# Altium schematic symbol library IC.SchLib: 555 symbols (part 1 of 15)
Pins are listed as number, name and electrical type; pins without a type are passive.

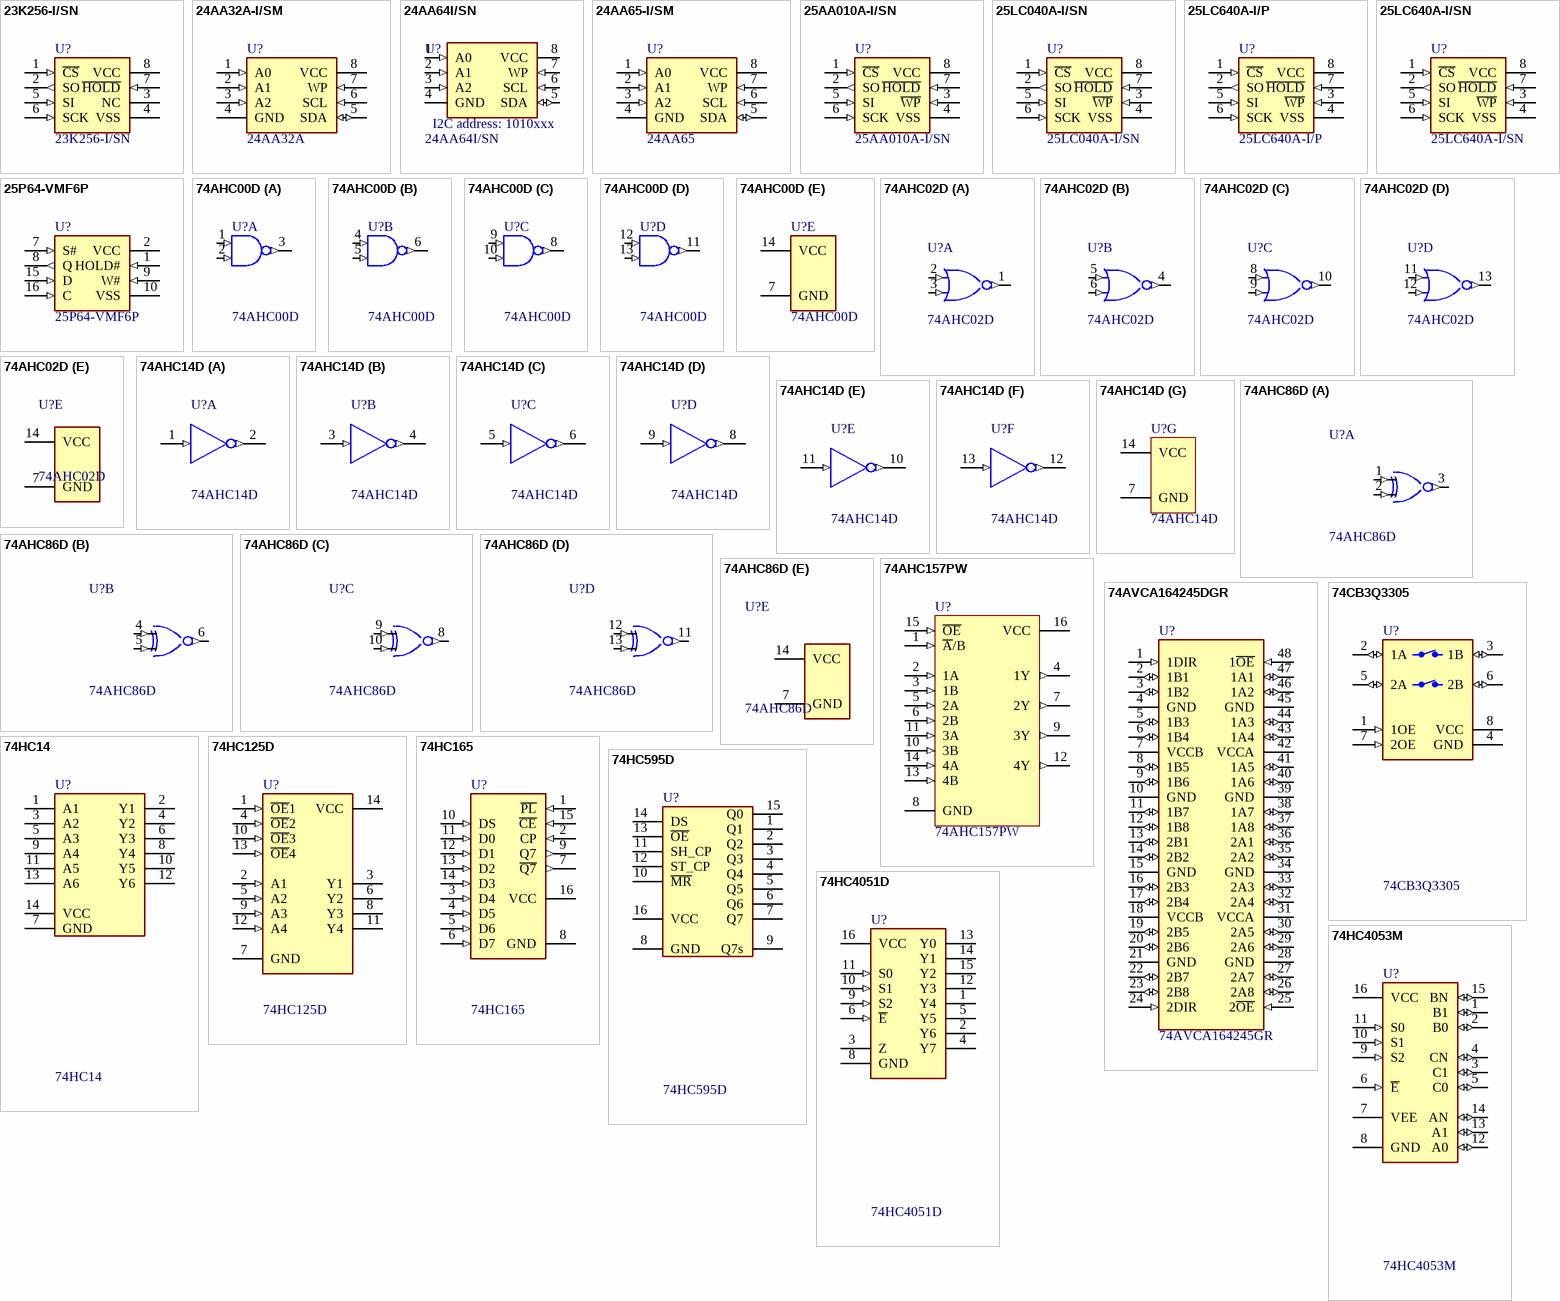
[diagram p0: symbols 23K256-I/SN to 74HC4053M]

## 23K256-I/SN
designator U?
SRAM 256kbit SPI SOIC8; Manufacturer: Microchip, Farnell; Manufacturer No: 23K256-I/SN, 1695547; Comment2: 256Kbit 2.7-3.6V 20MHz SPI; Sort: 510; Tech: SMDR; Package: SOIC8; Price: 1.5
signal-integrity model Model Name (Model Description)
footprint SOIC8-1
pins: 1 ~{CS} (in), 2 SO (out), 3 NC, 4 VSS (power), 5 SI (in), 6 SCK (in), 7 ~{HOLD} (in), 8 VCC (power)

## 24AA32A-I/SM
designator U?, comment 24AA32A
EEPROM 32K I2C Serial EEPROM 1.7-5.5V SOIC8; Manufacturer: Microchip; Manufacturer No: 24AA32A-I/SM; Sort: 510; Tech: SMDR; Package: SOIJ; Price: 0
signal-integrity model Model Name (Model Description)
footprint SOIC8W1 (SOIC 8 pin 5.3mm wide)
pins: 1 A0 (in), 2 A1 (in), 3 A2 (in), 4 GND (power), 5 SDA (io), 6 SCL (in), 7 WP (in), 8 VCC (power)

## 24AA64I/SN
designator U?  I2C address: 1010xxx
EEPROM 8kbyte I2C 1.7-5.5V SOIC8; Manufacturer: Microchip, Farnell; Manufacturer No: 24AA64I/SN, 1331304; Comment2: 1,7~5,5Vcc 3mAcc 400KHz; Sort: 510; Tech: SMDR; Package: SOIC8; Price: 0.6
signal-integrity model Model Name (Model Description)
footprint SOIC8-1
pins: 1 A0 (in), 2 A1 (in), 3 A2 (in), 4 GND (power), 5 SDA (io), 6 SCL (in), 7 WP (in), 8 VCC (power)

## 24AA65-I/SM
designator U?, comment 24AA65
EEPROM 64K I2C Smart Serial EEPROM 1.8-6.0V SOIC8; Manufacturer: Microchip; Manufacturer No: 24AA65-I/SM; Sort: 510; Tech: SMDR; Package: SOIJ; Price: 0
signal-integrity model Model Name (Model Description)
footprint SOIC8W1 (SOIC 8 pin 5.3mm wide)
pins: 1 A0 (in), 2 A1 (in), 3 A2 (in), 4 GND (power), 5 SDA (io), 6 SCL (in), 7 WP (in), 8 VCC (power)

## 25AA010A-I/SN
designator U?
EEPROM 1kbit SPI 1.8-5.5V SOIC8; Manufacturer: Microchip, Farnell; Manufacturer No: 25AA010A-I/SN, 1331339; Comment2: 1Kbit 1.8-5.5V 10MHz SPI; Sort: 510; Tech: SMDR; Package: SOIC8; Price: 0,5
signal-integrity model Model Name (Model Description)
footprint SOIC8-1
pins: 1 ~{CS} (in), 2 SO (out), 3 ~{WP} (in), 4 VSS (power), 5 SI (in), 6 SCK (in), 7 ~{HOLD} (in), 8 VCC (power)

## 25LC040A-I/SN
designator U?
EEPROM 4kbit SPI 2.5-5.5V SOIC8; Manufacturer: Microchip; Comment2: 4Kbit 2.5-5.5V 10MHz SPI; Sort: 510; Tech: SMDR; Manufacturer No: 25LC040A-I/SN; Package: SOIC8; Price: 0
signal-integrity model Model Name (Model Description)
footprint SOIC8-1
pins: 1 ~{CS} (in), 2 SO (out), 3 ~{WP} (in), 4 VSS (power), 5 SI (in), 6 SCK (in), 7 ~{HOLD} (in), 8 VCC (power)

## 25LC640A-I/P
designator U?
EEPROM 64kbit SPI 2.5-5.5V PDIP8; Manufacturer: Microchip; Comment2: 64Kbit 2.5-5.5V 10MHz SPI; Sort: 510; Tech: SMDR; Manufacturer No: 25LC640A-I/P; Package: PDIP8; Price: 0
signal-integrity model Model Name (Model Description)
footprint PDIL8 (DIP; 8 Leads; Row Spacing 7.62 mm; Pitch 2.54 mm)
pins: 1 ~{CS} (in), 2 SO (out), 3 ~{WP} (in), 4 VSS (power), 5 SI (in), 6 SCK (in), 7 ~{HOLD} (in), 8 VCC (power)

## 25LC640A-I/SN
designator U?
EEPROM 8kbit SPI 2.5-5.5V SOIC8; Manufacturer: Microchip; Comment2: 64Kbit 2.5-5.5V 10MHz SPI; Sort: 510; Tech: SMDR; Manufacturer No: 25LC640A-I/SN; Package: SOIC8; Price: 0
signal-integrity model Model Name (Model Description)
footprint SOIC8-1
pins: 1 ~{CS} (in), 2 SO (out), 3 ~{WP} (in), 4 VSS (power), 5 SI (in), 6 SCK (in), 7 ~{HOLD} (in), 8 VCC (power)

## 25P64-VMF6P
designator U?
EEPROM 64Mbit SPI 2.5-3.3V 33.3/68MHz read; Manufacturer: STM; Sort: 510; Tech: SMDR; Manufacturer No: 25P64-VMF6P; Package: SOIC16W; Price: 0
signal-integrity model Model Name (Model Description)
footprint SOIC16WN (SOIC, 16-Leads, Body 10,4x7,5mm (max), Pitch 1,27mm, IPC Medium Density)
pins: 1 HOLD# (in), 2 VCC (power), 7 S# (in), 8 Q (out), 9 W# (in), 10 VSS (power), 15 D (in), 16 C (in)

## 74AHC00D
designator U?
Quad NAND gate; Manufacturer No: SN74HC00D; Sort: 510; Tech: SMDR; Package: SOIC14; Price: 0
3D model D014 (14-Pin Small Outline Integrated Circuit 1.27 mm Pitch)
signal-integrity model SN74AHC14D
footprint SOIC14-1 (Small IC 14 pin)
part A pins: 1 A (in), 2 B (in), 3 Y (out)
part B pins: 4 B (in), 5 A (in), 6 Y (out)
part C pins: 8 Y (out), 9 B (in), 10 A (in)
part D pins: 11 Y (out), 12 B (in), 13 A (in)
part E pins: 7 GND (power), 14 VCC (power)

## 74AHC02D
designator U?
Quad NOR gate; Manufacturer No: SN74HC02D; Sort: 510; Tech: SMDR; Package: SOIC14; Price: 0
3D model D014 (14-Pin Small Outline Integrated Circuit 1.27 mm Pitch)
signal-integrity model SN74AHC14D
footprint SOIC14-1 (Small IC 14 pin)
part A pins: 1 Y (out), 2 A (in), 3 B (in)
part B pins: 4 Y (out), 5 A (in), 6 B (in)
part C pins: 8 A (in), 9 B (in), 10 Y (out)
part D pins: 11 A (in), 12 B (in), 13 Y (out)
part E pins: 7 GND (power), 14 VCC (power)

## 74AHC14D
designator U?
Hex Schmitt-Trigger Inverter; Sort: 510; Tech: SMDR; Package: SOIC14; Price: 0
3D model D014 (14-Pin Small Outline Integrated Circuit 1.27 mm Pitch)
signal-integrity model SN74AHC14D
footprint SOIC14-1 (Small IC 14 pin)
part A pins: 1 A (in), 2 Y (out)
part B pins: 3 A (in), 4 Y (out)
part C pins: 5 A (in), 6 Y (out)
part D pins: 8 Y (out), 9 A (in)
part E pins: 10 Y (out), 11 A (in)
part F pins: 12 Y (out), 13 A (in)
part G pins: 7 GND (power), 14 VCC (power)

## 74AHC86D
designator U?
Quad NAND gate; Manufacturer No: SN74HC86D; Sort: 510; Tech: SMDR; Package: SOIC14; Price: 0
3D model D014 (14-Pin Small Outline Integrated Circuit 1.27 mm Pitch)
signal-integrity model SN74AHC14D
footprint SOIC14-1 (Small IC 14 pin)
part A pins: 1 A (in), 2 B (in), 3 Y (out)
part B pins: 4 B (in), 5 A (in), 6 Y (out)
part C pins: 8 Y (out), 9 B (in), 10 A (in)
part D pins: 11 Y (out), 12 B (in), 13 A (in)
part E pins: 7 GND (power), 14 VCC (power)

## 74AHC157PW
designator U?
Quadruple 2-Line to 1-Line Data Selector/Multiplexer; Manufacturer No: SN74AHC157PWG4; Manufacturer: Texas; Tech: SMDR; Sort: 510; Package: TSSOP16
footprint TSSOP16 (TSSOP16 5x4.4mm R0.65mm)
signal-integrity model SN74AHC157PW
pins: 1 ~{A}/B (in), 2 1A (in), 3 1B (in), 4 1Y (out), 5 2A (in), 6 2B (in), 7 2Y (out), 8 GND (power), 9 3Y (out), 10 3B (in), 11 3A (in), 12 4Y (out), 13 4B (in), 14 4A (in), 15 ~{OE} (in), 16 VCC (power)

## 74AVCA164245DGR
designator U?, comment 74AVCA164245GR
16-BIT DUAL-SUPPLY BUS TRANSCEIVER; Manufacturer: Texas Instruments; Manufacturer No: SN74AVCA164245GR; Sort: 510; Tech: SMDR; Price: 0
footprint Model Name (Footprint not found)
footprint DGG048IT (Shrink Small Outline; 48 Leads; Body Width 6.1 mm; Pitch 0.5 mm)
pins: 1 1DIR (in), 2 1B1 (io), 3 1B2 (io), 4 GND (power), 5 1B3 (io), 6 1B4 (io), 7 VCCB (power), 8 1B5 (io), 9 1B6 (io), 10 GND (power), 11 1B7 (io), 12 1B8 (io), 13 2B1 (io), 14 2B2 (io), 15 GND (power), 16 2B3 (io), 17 2B4 (io), 18 VCCB (power), 19 2B5 (io), 20 2B6 (io), 21 GND (power), 22 2B7 (io), 23 2B8 (io), 24 2DIR (in), 25 2~{OE} (in), 26 2A8 (io), 27 2A7 (io), 28 GND (power), 29 2A6 (io), 30 2A5 (io), 31 VCCA (power), 32 2A4 (io), 33 2A3 (io), 34 GND (power), 35 2A2 (io), 36 2A1 (io), 37 1A8 (io), 38 1A7 (io), 39 GND (power), 40 1A6 (io), 41 1A5 (io), 42 VCCA (power), 43 1A4 (io), 44 1A3 (io), 45 GND (power), 46 1A2 (io), 47 1A1 (io), 48 1~{OE} (in)

## 74CB3Q3305
designator U?
Dual FET bus switch 2.5-3.3V high bandwidth; Manufacturer: Texas, Farnell; Manufacturer No: SN74CB3Q3305, 1601165; Sort: 510; Tech: SMDR; Package: TSSOP8; Comment2: 2.5-3.3V; Price: 1; RevDate: 10.03.2009 LZ
footprint TSSOP8-PW (TSSOP8 3x3mm R0.65mm)
pins: 1 1OE (in), 2 1A (io), 3 1B (io), 4 GND (power), 5 2A (io), 6 2B (io), 7 2OE (in), 8 VCC (power)

## 74HC14
designator U?
Hex Inverting Schmitt Trigger; Manufacturer: Fairchild, Farnell; Manufacturer No: MM74HC14M, 1013958; Sort: 510; Tech: SMDR; Package: SOIC14; Price: 0.4
footprint SOIC14-1 (Small IC 14 pin)
pins: 1 A1, 2 Y1, 3 A2, 4 Y2, 5 A3, 6 Y3, 7 GND, 8 Y4, 9 A4, 10 Y5, 11 A5, 12 Y6, 13 A6, 14 VCC (power)

## 74HC125D
designator U?
Quadruple Bus Buffer Gate with 3-State Outputs; Manufacturer No: SN74AHC125D; Manufacturer: Texas; Tech: SMDR; Sort: 510; Package: SOIC14
footprint SOIC14-1 (Small IC 14 pin)
pins: 1 ~{OE}1 (in), 2 A1 (in), 3 Y1 (hiz), 4 ~{OE}2 (in), 5 A2 (in), 6 Y2 (hiz), 7 GND (power), 8 Y3 (hiz), 9 A3 (in), 10 ~{OE}3 (in), 11 Y4 (hiz), 12 A4 (in), 13 ~{OE}4 (in), 14 VCC (power)

## 74HC165
designator U?
Quadruple 2-Line to 1-Line Data Selector/Multiplexer; Manufacturer: Texas; Tech: SMDR; Sort: 510; Manufacturer No: 74HC165; Package: TSSOP16
footprint TSSOP16 (TSSOP16 5x4.4mm R0.65mm)
signal-integrity model SN74AHC157PW
pins: 1 ~{PL} (in), 2 CP (in), 3 D4 (in), 4 D5 (in), 5 D6 (in), 6 D7 (in), 7 ~{Q7} (out), 8 GND (power), 9 Q7 (out), 10 DS (in), 11 D0 (in), 12 D1 (in), 13 D2 (in), 14 D3 (in), 15 ~{CE} (in), 16 VCC (power)

## 74HC595D
designator U?
8-bit serial-in, serial or parallel-out  shift register with output latches;  3-state; Manufacturer: NXP, Farnell; Manufacturer No: 74HC595D, 1201269; Sort: 510; Tech: SMDR; Package: SOIC16; Price: 0.4
footprint SOIC16-1 (Small IC 16 pin)
pins: 1 Q1, 2 Q2, 3 Q3, 4 Q4, 5 Q5, 6 Q6, 7 Q7, 8 GND, 9 Q7s, 10 ~{MR}, 11 SH_CP, 12 ST_CP, 13 ~{OE}, 14 DS, 15 Q0, 16 VCC (power)

## 74HC4051D
designator U?
8-channel analog multiplexer/demultiplexer; Manufacturer: NXP; Sort: 510; Tech: SMDR; Manufacturer No: 74HC4051D; Package: SOIC16; Price: 0.4
footprint SOIC16-1 (Small IC 16 pin)
pins: 1 Y4, 2 Y6, 3 Z, 4 Y7, 5 Y5, 6 ~{E} (in), 8 GND (power), 9 S2 (in), 10 S1 (in), 11 S0 (in), 12 Y3, 13 Y0, 14 Y1, 15 Y2, 16 VCC (power)

## 74HC4053M
designator U?
3x2-channel analog multiplexer/demultiplexer; Manufacturer: Texas, Farnell; Manufacturer No: 74HC4053M, 1103172; Sort: 510; Tech: SMDR; Package: SOIC16; Price: 0.4
footprint SOIC16-1 (Small IC 16 pin)
pins: 1 B1 (io), 2 B0 (io), 3 C1 (io), 4 CN (io), 5 C0 (io), 6 ~{E} (in), 7 VEE (power), 8 GND (power), 9 S2 (in), 10 S1 (in), 11 S0 (in), 12 A0 (io), 13 A1 (io), 14 AN (io), 15 BN (io), 16 VCC (power)

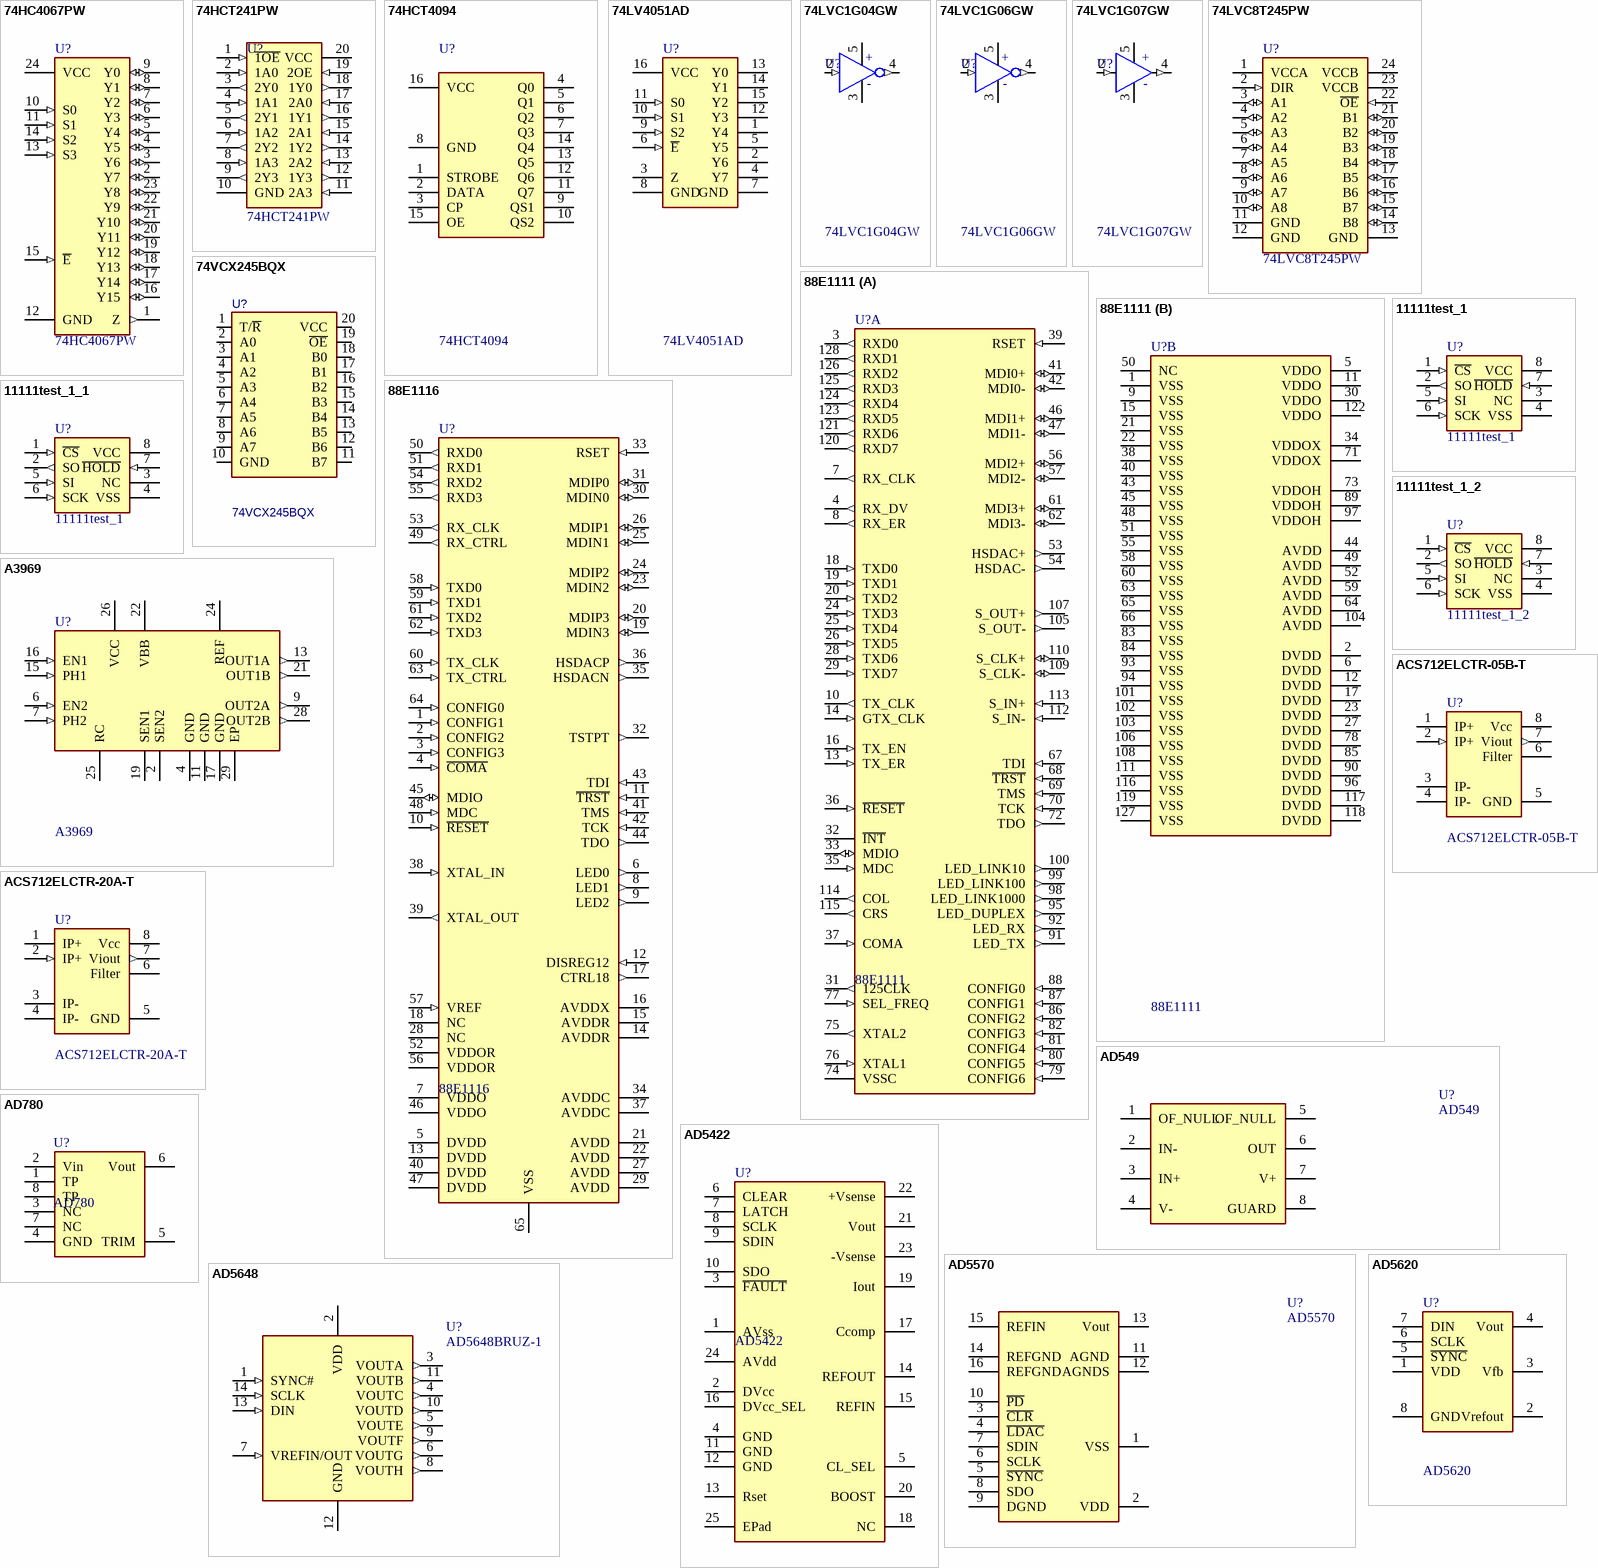
[diagram p1: symbols 74HC4067PW to AD5648]

## 74HC4067PW
designator U?
16-channel analog multiplexer/demultiplexer; Manufacturer: NXP; Sort: 510; Tech: SMDR; Manufacturer No: 74HC4067PW; Package: TSSOP24; Price: 0.4
footprint TSSOP24-TI (Plastic Small Outline 24pin R0.65mm 7.8x4.4x1.2mm)
pins: 1 Z (out), 2 Y7 (io), 3 Y6 (io), 4 Y5 (io), 5 Y4 (io), 6 Y3 (io), 7 Y2 (io), 8 Y1 (io), 9 Y0 (io), 10 S0 (in), 11 S1 (in), 12 GND (power), 13 S3 (in), 14 S2 (in), 15 ~{E} (in), 16 Y15 (io), 17 Y14 (io), 18 Y13 (io), 19 Y12 (io), 20 Y11 (io), 21 Y10 (io), 22 Y9 (io), 23 Y8 (io), 24 VCC (power)

## 74HCT241PW
designator U?
Octal buffer/line driver; 3-state; Manufacturer: NXP; Sort: 510; Tech: SMDR; Manufacturer No: 74HCT241PW; Package: TSSOP20; Price: 0
footprint TSSOP20N (TSOP 20, Body 6,6x4,5mm, R0,65mm, IPC Medium Density)
pins: 1 ~{1OE} (in), 2 1A0 (in), 3 2Y0 (out), 4 1A1 (in), 5 2Y1 (out), 6 1A2 (in), 7 2Y2 (out), 8 1A3 (in), 9 2Y3 (out), 10 GND (power), 11 2A3 (in), 12 1Y3 (out), 13 2A2 (in), 14 1Y2 (out), 15 2A1 (in), 16 1Y1 (out), 17 2A0 (in), 18 1Y0 (out), 19 2OE (in), 20 VCC (power)

## 74HCT4094
designator U?
High-Speed CMOS Logic 8-Stage Shift and Store Bus Register, Three State; Manufacturer: Texas; Manufacturer No: CD74HCT4094M; Sort: 510; Tech: SMDR; Package: SOIC16; Price: 0.4
footprint SOIC16-1 (Small IC 16 pin)
pins: 1 STROBE, 2 DATA, 3 CP, 4 Q0, 5 Q1, 6 Q2, 7 Q3, 8 GND, 9 QS1, 10 QS2, 11 Q7, 12 Q6, 13 Q5, 14 Q4, 15 OE, 16 VCC

## 74LV4051AD
designator U?
8-channel analog multiplexer/demultiplexer; Manufacturer: Texas, Farnell; Manufacturer No: SN74LV4051AD, 1740189; Comment2: 2-5.5Vcc; Sort: 510; Tech: SMDR; Package: SOIC16; Price: 0.4
footprint SOIC16-1 (Small IC 16 pin)
pins: 1 Y4, 2 Y6, 3 Z, 4 Y7, 5 Y5, 6 ~{E} (in), 7 GND (power), 8 GND (power), 9 S2 (in), 10 S1 (in), 11 S0 (in), 12 Y3, 13 Y0, 14 Y1, 15 Y2, 16 VCC (power)

## 74LVC1G04GW
designator U?
Single inverter; 5 V tolerant input; ±24 mA output (3V); Manufacturer: NXP; Comment2: 1.65V to 5.5V; Sort: 510; Tech: SMDR; Manufacturer No: 74LVC1G04GW; Package: TSSOP5; Price: 0
footprint SC70-5 (5-Leads, Body 2,0x2,1mm (max), Pitch 0,65mm, IPC Medium Density)
pins: 2 A (in), 3 GND (power), 4 Y (out), 5 VCC (power)
text: +; -

## 74LVC1G06GW
designator U?
Single Inverter; 5 V tolerant input; -24 mA open drain output (3V); Manufacturer: NXP; Comment2: 1.65V to 5.5V; Sort: 510; Tech: SMDR; Manufacturer No: 74LVC1G06GW; Package: SC70-5; Price: 0
footprint SC70-5 (5-Leads, Body 2,0x2,1mm (max), Pitch 0,65mm, IPC Medium Density)
pins: 2 A (in), 3 GND (power), 4 Y (out), 5 VCC (power)
text: +; -

## 74LVC1G07GW
designator U?
Single buffer; 5 V tolerant input; -24 mA open drain output (3V); Manufacturer: NXP; Comment2: 1.65V to 5.5V; Sort: 510; Tech: SMDR; Manufacturer No: 74LVC1G07GW; Package: SC70-5; Price: 0
footprint SC70-5 (5-Leads, Body 2,0x2,1mm (max), Pitch 0,65mm, IPC Medium Density)
pins: 2 A (in), 3 GND (power), 4 Y (out), 5 VCC (power)
text: +; -

## 74LVC8T245PW
designator U?
8-BIT DUAL-SUPPLY BUS TRANSCEIVER; Manufacturer: Texas Instruments; Manufacturer No: SN74LVC8T245PW; Sort: 510; Tech: SMDR; Price: 0
footprint TSSOP24-TI (Plastic Small Outline 24pin R0.65mm 7.8x4.4x1.2mm)
signal-integrity model Model Name (Model Description)
pins: 1 VCCA (power), 2 DIR (in), 3 A1 (io), 4 A2 (io), 5 A3 (io), 6 A4 (io), 7 A5 (io), 8 A6 (io), 9 A7 (io), 10 A8 (io), 11 GND (power), 12 GND (power), 13 GND (power), 14 B8 (io), 15 B7 (io), 16 B6 (io), 17 B5 (io), 18 B4 (io), 19 B3 (io), 20 B2 (io), 21 B1 (io), 22 ~{OE} (in), 23 VCCB (power), 24 VCCB (power)

## 74VCX245BQX
designator U?
Low Voltage Bidirectional Transceiver  with 3.6V Tolerant Inputs and Outputs; Manufacturer: Fairchild, Mouser; Manufacturer No: 74VCX245BQX, 512-74VCX245BQX; Comment2: 1.4..3.6Vcc; Sort: 510; Tech: SMDR; Package: DQFN20 4.5x2.5mm; Price: 0.95
footprint QFN50P250X450X80-20N (QFN, 20-Leads, Body 4,5x2,5mm (max), Pitch 0,50mm, IPC Medium Density)
signal-integrity model Model Name (Model Description)
pins: 1 T/~{R} (io), 2 A0 (io), 3 A1 (io), 4 A2 (io), 5 A3 (io), 6 A4 (io), 7 A5 (io), 8 A6 (io), 9 A7 (io), 10 GND (io), 11 B7 (io), 12 B6 (io), 13 B5 (io), 14 B4 (io), 15 B3 (io), 16 B2 (io), 17 B1 (io), 18 B0 (io), 19 ~{OE} (io), 20 VCC (io), 21 EP (power)

## 88E1111
designator U?
Single Port 10/100 Mb/s Ethernet Physical Layer Transceiver; Manufacturer: Marvell; Manufacturer No: 88E1111-B2-RCJ-1C000; Sort: 510; Tech: SMDR; Package: PQFP128; Price: 0
footprint PQFP128-1 (PQFP, 128-Leads, Body 23,4x17,4mm (max), Pitch 0,50mm, IPC Medium Density)
part A pins: 3 RXD0 (out), 4 RX_DV (out), 7 RX_CLK (out), 8 RX_ER (out), 10 TX_CLK (out), 13 TX_ER (in), 14 GTX_CLK (in), 16 TX_EN (in), 18 TXD0 (in), 19 TXD1 (in), 20 TXD2 (in), 24 TXD3 (in), 25 TXD4 (in), 26 TXD5 (in), 28 TXD6 (in), 29 TXD7 (in), 31 125CLK (out), 32 ~{INT} (oc), 33 MDIO (io), 35 MDC (in), 36 ~{RESET} (in), 37 COMA (in), 39 RSET (in), 41 MDI0+ (io), 42 MDI0- (io), 46 MDI1+ (io), 47 MDI1- (io), 53 HSDAC+ (out), 54 HSDAC- (out), 56 MDI2+ (io), 57 MDI2- (io), 61 MDI3+ (io), 62 MDI3- (io), 67 TDI (in), 68 ~{TRST} (in), 69 TMS (in), 70 TCK (in), 72 TDO (out), 74 VSSC (power), 75 XTAL2 (out), 76 XTAL1 (in), 77 SEL_FREQ (in), 79 CONFIG6 (in), 80 CONFIG5 (in), 81 CONFIG4 (in), 82 CONFIG3 (in), 86 CONFIG2 (in), 87 CONFIG1 (in), 88 CONFIG0 (in), 91 LED_TX (out), 92 LED_RX (out), 95 LED_DUPLEX (out), 98 LED_LINK1000 (out), 99 LED_LINK100 (out), 100 LED_LINK10 (out), 105 S_OUT- (out), 107 S_OUT+ (out), 109 S_CLK- (io), 110 S_CLK+ (io), 112 S_IN- (in), 113 S_IN+ (in), 114 COL (out), 115 CRS (out), 120 RXD7 (out), 121 RXD6 (out), 123 RXD5 (out), 124 RXD4 (out), 125 RXD3 (out), 126 RXD2 (out), 128 RXD1 (out)
part B pins: 1 VSS (power), 2 DVDD (power), 5 VDDO (power), 6 DVDD (power), 9 VSS (power), 11 VDDO (power), 12 DVDD (power), 15 VSS (power), 17 DVDD (power), 21 VSS (power), 22 VSS (power), 23 DVDD (power), 27 DVDD (power), 30 VDDO (power), 34 VDDOX (power), 38 VSS (power), 40 VSS (power), 43 VSS (power), 44 AVDD (power), 45 VSS (power), 48 VSS (power), 49 AVDD (power), 50 NC, 51 VSS (power), 52 AVDD (power), 55 VSS (power), 58 VSS (power), 59 AVDD (power), 60 VSS (power), 63 VSS (power), 64 AVDD (power), 65 VSS (power), 66 VSS (power), 71 VDDOX (power), 73 VDDOH (power), 78 DVDD (power), 83 VSS (power), 84 VSS (power), 85 DVDD (power), 89 VDDOH (power), 90 DVDD (power), 93 VSS (power), 94 VSS (power), 96 DVDD (power), 97 VDDOH (power), 101 VSS (power), 102 VSS (power), 103 VSS (power), 104 AVDD (power), 106 VSS (power), 108 VSS (power), 111 VSS (power), 116 VSS (power), 117 DVDD (power), 118 DVDD (power), 119 VSS (power), 122 VDDO (power), 127 VSS (power)

## 88E1116
designator U?
Single Port 10/100/1000 Mb/s Ethernet Physical Layer Transceiver; Manufacturer: Marvell; Manufacturer No: 88e1116-XX-NNC1C000; Comment2: XX is custom code; Sort: 510; Tech: SMDR; Package: QFN64LT; Price: 0
footprint QFN64LT-2
pins: 1 CONFIG1 (in), 2 CONFIG2 (in), 3 CONFIG3 (in), 4 ~{COMA} (in), 5 DVDD (power), 6 LED0 (out), 7 VDDO (power), 8 LED1 (out), 9 LED2 (out), 10 ~{RESET} (in), 11 ~{TRST} (in), 12 DISREG12 (in), 13 DVDD (power), 14 AVDDR (power), 15 AVDDR (power), 16 AVDDX (power), 17 CTRL18 (out), 18 NC, 19 MDIN3 (io), 20 MDIP3 (io), 21 AVDD (power), 22 AVDD (power), 23 MDIN2 (io), 24 MDIP2 (io), 25 MDIN1 (io), 26 MDIP1 (io), 27 AVDD (power), 28 NC, 29 AVDD (power), 30 MDIN0 (io), 31 MDIP0 (io), 32 TSTPT (out), 33 RSET (in), 34 AVDDC (power), 35 HSDACN (out), 36 HSDACP (out), 37 AVDDC (power), 38 XTAL_IN (in), 39 XTAL_OUT (out), 40 DVDD (power), 41 TMS (in), 42 TCK (in), 43 TDI (in), 44 TDO (out), 45 MDIO (io), 46 VDDO (power), 47 DVDD (power), 48 MDC (in), 49 RX_CTRL (out), 50 RXD0 (out), 51 RXD1 (out), 52 VDDOR (power), 53 RX_CLK (out), 54 RXD2 (out), 55 RXD3 (out), 56 VDDOR (power), 57 VREF (in), 58 TXD0 (in), 59 TXD1 (in), 60 TX_CLK (in), 61 TXD2 (in), 62 TXD3 (in), 63 TX_CTRL (in), 64 CONFIG0 (in), 65 VSS (power)

## 11111test_1
designator U?
SRAM 256kbit SPI SOIC8; Manufacturer: Microchip, Farnell; Manufacturer No: 23K256-I/SN, 1695547; Comment2: 256Kbit 2.7-3.6V 20MHz SPI; Sort: 510; Tech: SMDR; Package: SOIC8; Price: 1.5
signal-integrity model Model Name (Model Description)
footprint SOIC8-1
pins: 1 ~{CS} (in), 2 SO (out), 3 NC, 4 VSS (power), 5 SI (in), 6 SCK (in), 7 ~{HOLD} (in), 8 VCC (power)

## 11111test_1_1
designator U?, comment 11111test_1
SRAM 256kbit SPI SOIC8; Manufacturer: Microchip, Farnell; Manufacturer No: 23K256-I/SN, 1695547; Comment2: 256Kbit 2.7-3.6V 20MHz SPI; Sort: 510; Tech: SMDR; Package: SOIC8; Price: 1.5
signal-integrity model Model Name (Model Description)
footprint SOIC8-1
pins: 1 ~{CS} (in), 2 SO (out), 3 NC, 4 VSS (power), 5 SI (in), 6 SCK (in), 7 ~{HOLD} (in), 8 VCC (power)

## 11111test_1_2
designator U?
SRAM 256kbit SPI SOIC8; Manufacturer: Microchip, Farnell; Manufacturer No: 23K256-I/SN, 1695547; Comment2: 256Kbit 2.7-3.6V 20MHz SPI; Sort: 510; Tech: SMDR; Package: SOIC8; Price: 1.5
signal-integrity model Model Name (Model Description)
footprint SOIC8-1
pins: 1 ~{CS} (in), 2 SO (out), 3 NC, 4 VSS (power), 5 SI (in), 6 SCK (in), 7 ~{HOLD} (in), 8 VCC (power)

## A3969
designator U?
Dual Full-Bridge PWM Motor Driver; Manufacturer: Allegro; Manufacturer No: A3969SETTR-T; Sort: 510; Tech: SMDR; Package: QFN28; Price: 0
signal-integrity model Model Name (Model Description)
footprint QFN28-1 (QFN28; 28 Leads; Body Width 5.0 mm; Pitch 0.5 mm)
pins: 2 SEN2, 4 GND (power), 6 EN2 (in), 7 PH2 (in), 9 OUT2A (out), 11 GND (power), 13 OUT1A (out), 15 PH1 (in), 16 EN1 (in), 17 GND (power), 19 SEN1, 21 OUT1B (out), 22 VBB (power), 24 REF, 25 RC, 26 VCC (power), 28 OUT2B (out), 29 EP (power)

## ACS712ELCTR-05B-T
designator U?
Current Sensor Bidirectional 80KHz 5A; Manufacturer: Allegro, Farnell; Manufacturer No: ACS712ELCTR-05B-T, 1329623; Comment2: 4.5-5.5V  5Arange; Sort: 510; Tech: SMDR; Package: SOIC8; Price: 3.3
footprint SOIC8-1
pins: 1 IP+ (power), 2 IP+ (in), 3 IP- (power), 4 IP- (power), 5 GND (power), 6 Filter, 7 Viout (out), 8 Vcc (power)

## ACS712ELCTR-20A-T
designator U?
Current Sensor Bidirectional 80KHz 20A; Manufacturer: Allegro, Farnell; Manufacturer No: ACS712ELCTR-20A-T, 1329624; Comment2: 4.5-5.5V  20Arange; Sort: 510; Tech: SMDR; Package: SOIC8; Price: 3.3
footprint SOIC8-1
pins: 1 IP+ (power), 2 IP+ (in), 3 IP- (power), 4 IP- (power), 5 GND (power), 6 Filter, 7 Viout (out), 8 Vcc (power)

## AD549
designator U?
Ultralow Input Bias Current Operational Amplifier; Manufacturer: Analog Devices; Manufacturer No: AD549KHZ; Sort: 510; Tech: THDW; Package: TO99; Price: 0
footprint TO99 (TO-99)
pins: 1 OF_NULL, 2 IN-, 3 IN+, 4 V-, 5 OF_NULL, 6 OUT, 7 V+, 8 GUARD

## AD780
designator U?
High precision Reference 2.5/3.0V; Manufacturer: Analog, Farnell; Comment2: 2.5/3.0Vout 4..36Vin 0.04% 3ppm/C; Sort: 520; Tech: SMDR; Package: SOIC8; Price: 7,2
footprint SOIC8-1
pins: 1 TP, 2 Vin (power), 3 NC, 4 GND (power), 5 TRIM, 6 Vout (power), 7 NC, 8 TP

## AD5422
designator U?
Single Channel, 12-/16-Bit, Serial Input  Current Source and Voltage Output DACs; Manufacturer: Analog Devices; Manufacturer No: AD5422BREZ; Comment2: 16bit +/-5V SPI; Sort: 510; Tech: SMDR; Package: TSSOP24; Price: 0
signal-integrity model Model Name (Model Description)
footprint TSOP65P640X120_HS-24N (TSOP, 24-Leads, Body 7,9x4,5mm (max), Pitch 0,65mm, IPC Medium Density)
pins: 1 AVss (power), 2 DVcc (power), 3 ~{FAULT}, 4 GND (power), 5 CL_SEL, 6 CLEAR, 7 LATCH, 8 SCLK, 9 SDIN, 10 SDO, 11 GND (power), 12 GND (power), 13 Rset, 14 REFOUT, 15 REFIN, 16 DVcc_SEL, 17 Ccomp, 18 NC, 19 Iout, 20 BOOST, 21 Vout, 22 +Vsense, 23 -Vsense, 24 AVdd (power), 25 EPad (power)

## AD5570
designator U?
True Accuracy, 16-Bit ±12 V/±15 V,  Serial Input Voltage Output DAC; Manufacturer: Analog Devices; Manufacturer No: AD5570ARSZ; Sort: 510; Tech: SMDR; Package: SSOP16; Price: 0
footprint SOP65P780X200-16N (SOP, 16-Leads, Body 6,5x5,6mm (max), Pitch 0,65mm, IPC Medium Density)
pins: 1 VSS (power), 2 VDD (power), 3 ~{CLR}, 4 ~{LDAC}, 5 ~{SYNC}, 6 SCLK, 7 SDIN, 8 SDO, 9 DGND, 10 ~{PD}, 11 AGND, 12 AGNDS, 13 Vout, 14 REFGND, 15 REFIN, 16 REFGND

## AD5620
designator U?
Single, 12-/14-/16-Bit nanoDAC with 5ppm/C On.Chip Reference; Manufacturer: Analog Devices; Manufacturer No: AD5620CRMZ-2; Comment2: 12bit 3/5V SPI; Sort: 510; Tech: SMDR; Package: MSOP; Price: 0
signal-integrity model Model Name (Model Description)
footprint TSSOP8 (TSSOP8 3x3mm R0.65mm)
pins: 1 VDD, 2 Vrefout, 3 Vfb, 4 Vout, 5 ~{SYNC}, 6 SCLK, 7 DIN, 8 GND

## AD5648
designator U?, comment AD5648BRUZ-1
ADC 14bit Quad; Manufacturer: Analog Devices; Sort: 510; Tech: SMDR; Manufacturer No: AD5648BRUZ-1; Package: TSSOP14; Price: 0
footprint TSSOP14 (TSSOP16 5x4.4mm R0.65mm)
pins: 1 SYNC# (in), 2 VDD (power), 3 VOUTA (out), 4 VOUTC (out), 5 VOUTE (out), 6 VOUTG (out), 7 VREFIN/OUT (in), 8 VOUTH (out), 9 VOUTF (out), 10 VOUTD (out), 11 VOUTB (out), 12 GND (power), 13 DIN (in), 14 SCLK (in)

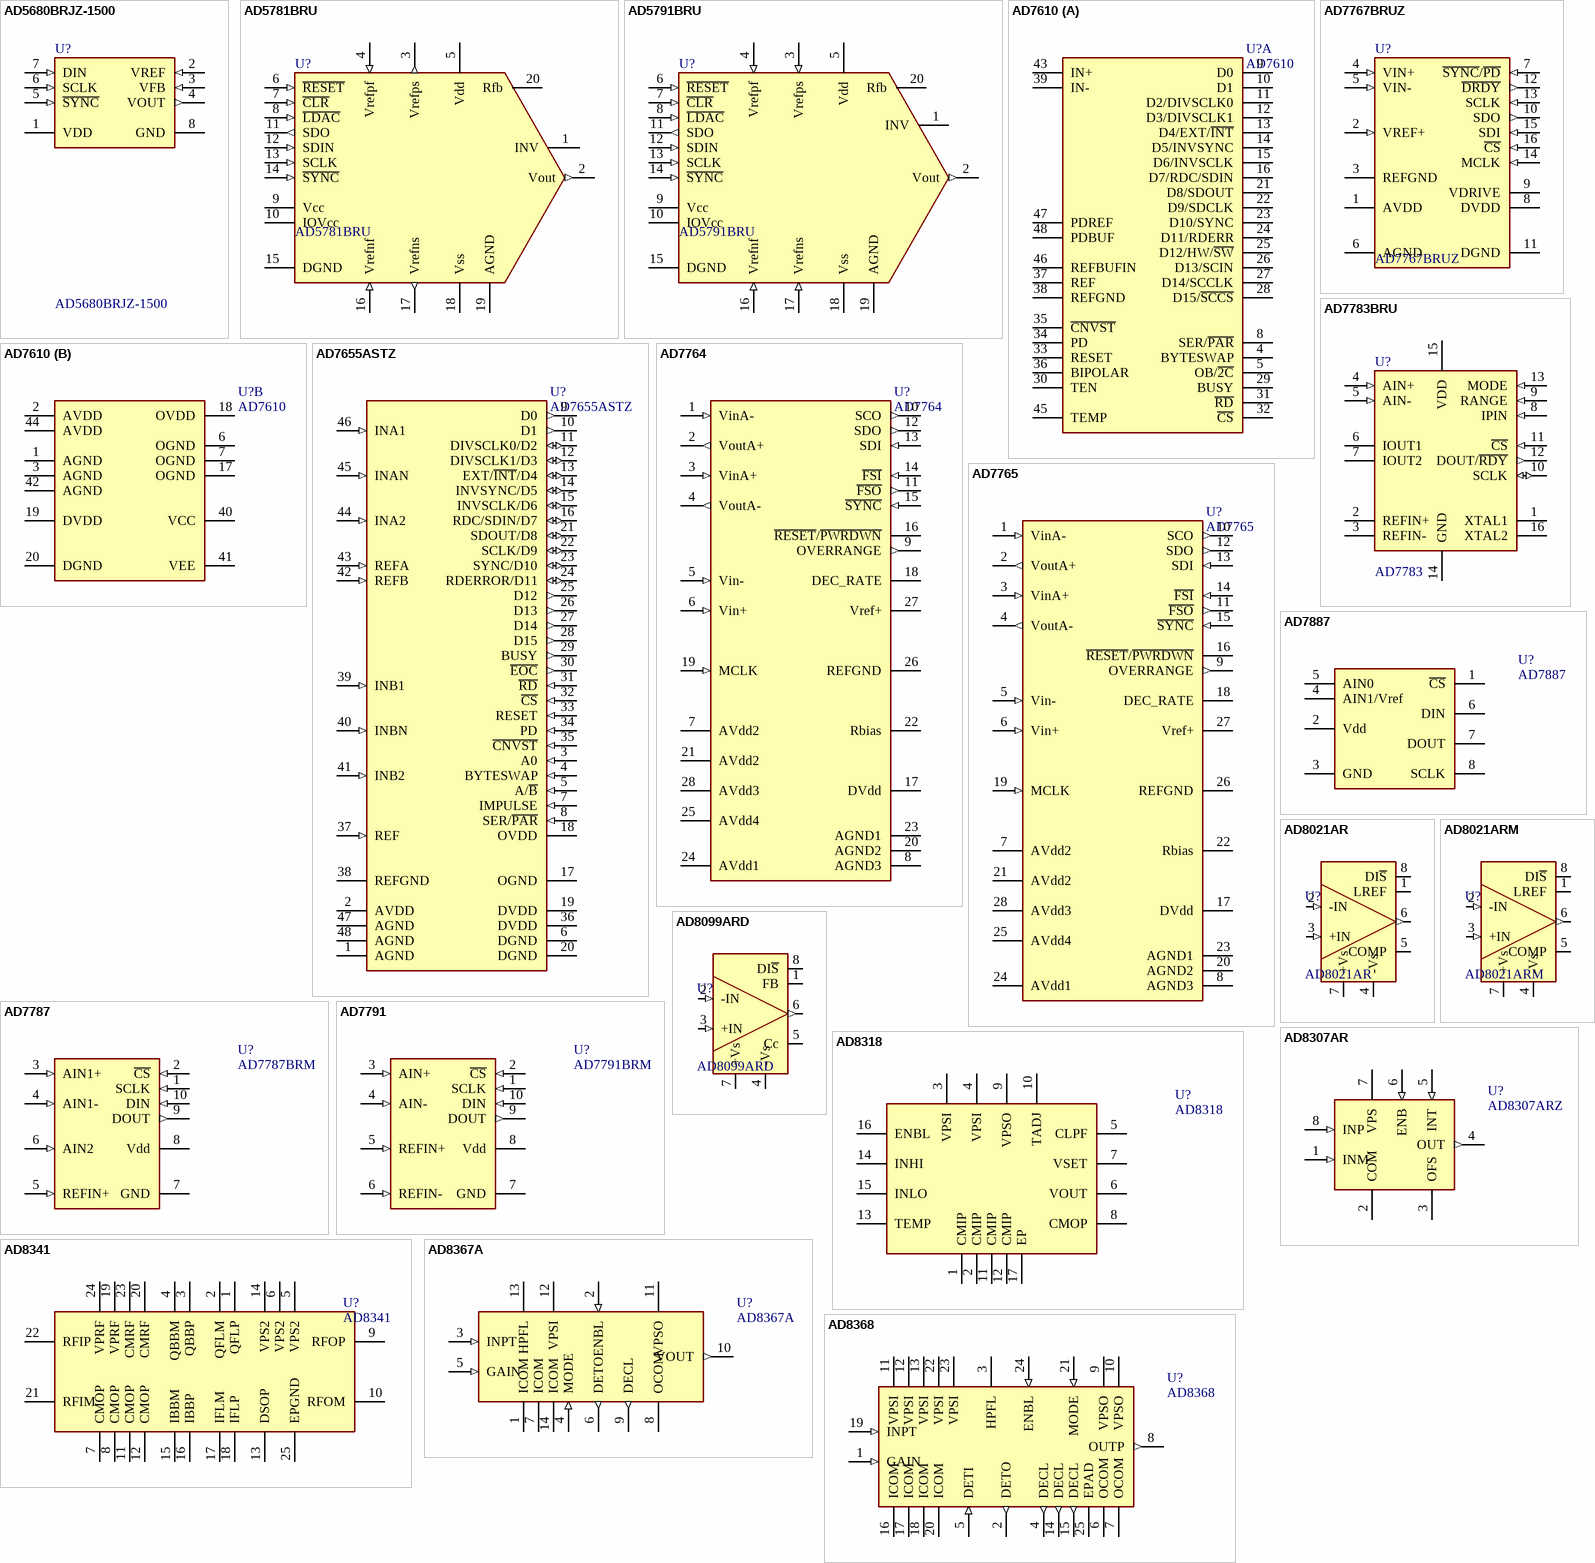
[diagram p2: symbols AD5680BRJZ-1500 to AD8368]

## AD5680BRJZ-1500
designator U?
nanoDAC 18bit whitout Vref / zero scale out on reset; Manufacturer: Analog Devices; Comment2: 5Vcc; Sort: 510; Tech: SMDR; Manufacturer No: AD5680BRJZ-1500; Package: SOT23-8; Price: 0
footprint SOT23-8
pins: 1 VDD (power), 2 VREF (in), 3 VFB (in), 4 VOUT (out), 5 ~{SYNC} (in), 6 SCLK (in), 7 DIN (in), 8 GND (power)

## AD5781BRU
designator U?
Single Channel 18bit, Serial Input Voltage Output DACs; Manufacturer: Analog, Farnell; Manufacturer No: AD5781BRUZ, 1843652; Comment2: 18bit 1MSPS SPI; Sort: 510; Tech: SMDR; Package: TSSOP20; Price: 35
signal-integrity model Model Name (Model Description)
footprint TSSOP20N (TSSOP 20, Body 6,6x4,5mm, R0,65mm, IPC Medium Density)
pins: 1 INV, 2 Vout (out), 3 Vrefps (out), 4 Vrefpf (in), 5 Vdd (power), 6 ~{RESET} (in), 7 ~{CLR} (in), 8 ~{LDAC} (in), 9 Vcc (power), 10 IOVcc (power), 11 SDO (out), 12 SDIN (in), 13 SCLK (in), 14 ~{SYNC} (in), 15 DGND (power), 16 Vrefnf (in), 17 Vrefns (out), 18 Vss (power), 19 AGND (power), 20 Rfb

## AD5791BRU
designator U?
Single Channel 20bit, Serial Input voltage Output DACs; Manufacturer: Analog, Farnell; Manufacturer No: AD5791BRUZ, 1864684; Comment2: 20bit 1MSPS SPI; Sort: 510; Tech: SMDR; Package: TSSOP20; Price: 110
signal-integrity model Model Name (Model Description)
footprint TSSOP20N (TSSOP 20, Body 6,6x4,5mm, R0,65mm, IPC Medium Density)
pins: 1 INV, 2 Vout (out), 3 Vrefps (in), 4 Vrefpf (in), 5 Vdd (power), 6 ~{RESET} (in), 7 ~{CLR} (in), 8 ~{LDAC} (in), 9 Vcc (power), 10 IOVcc (power), 11 SDO (out), 12 SDIN (in), 13 SCLK (in), 14 ~{SYNC} (in), 15 DGND (power), 16 Vrefnf (in), 17 Vrefns (in), 18 Vss (power), 19 AGND (power), 20 Rfb